# Altium footprint library CapacitorsTHD.PcbLib: 46 footprints (part 2 of 3)
Each footprint in its own frame and in the unit in brackets; x right, y up, seen from the top. Pads: shape width x height; smd on the part's side, far side on the other; paste and mask are expansions set on the pad; w line width, h text height; cw(c..) or ccw(c..) is an arc to the next point about the centre after c.
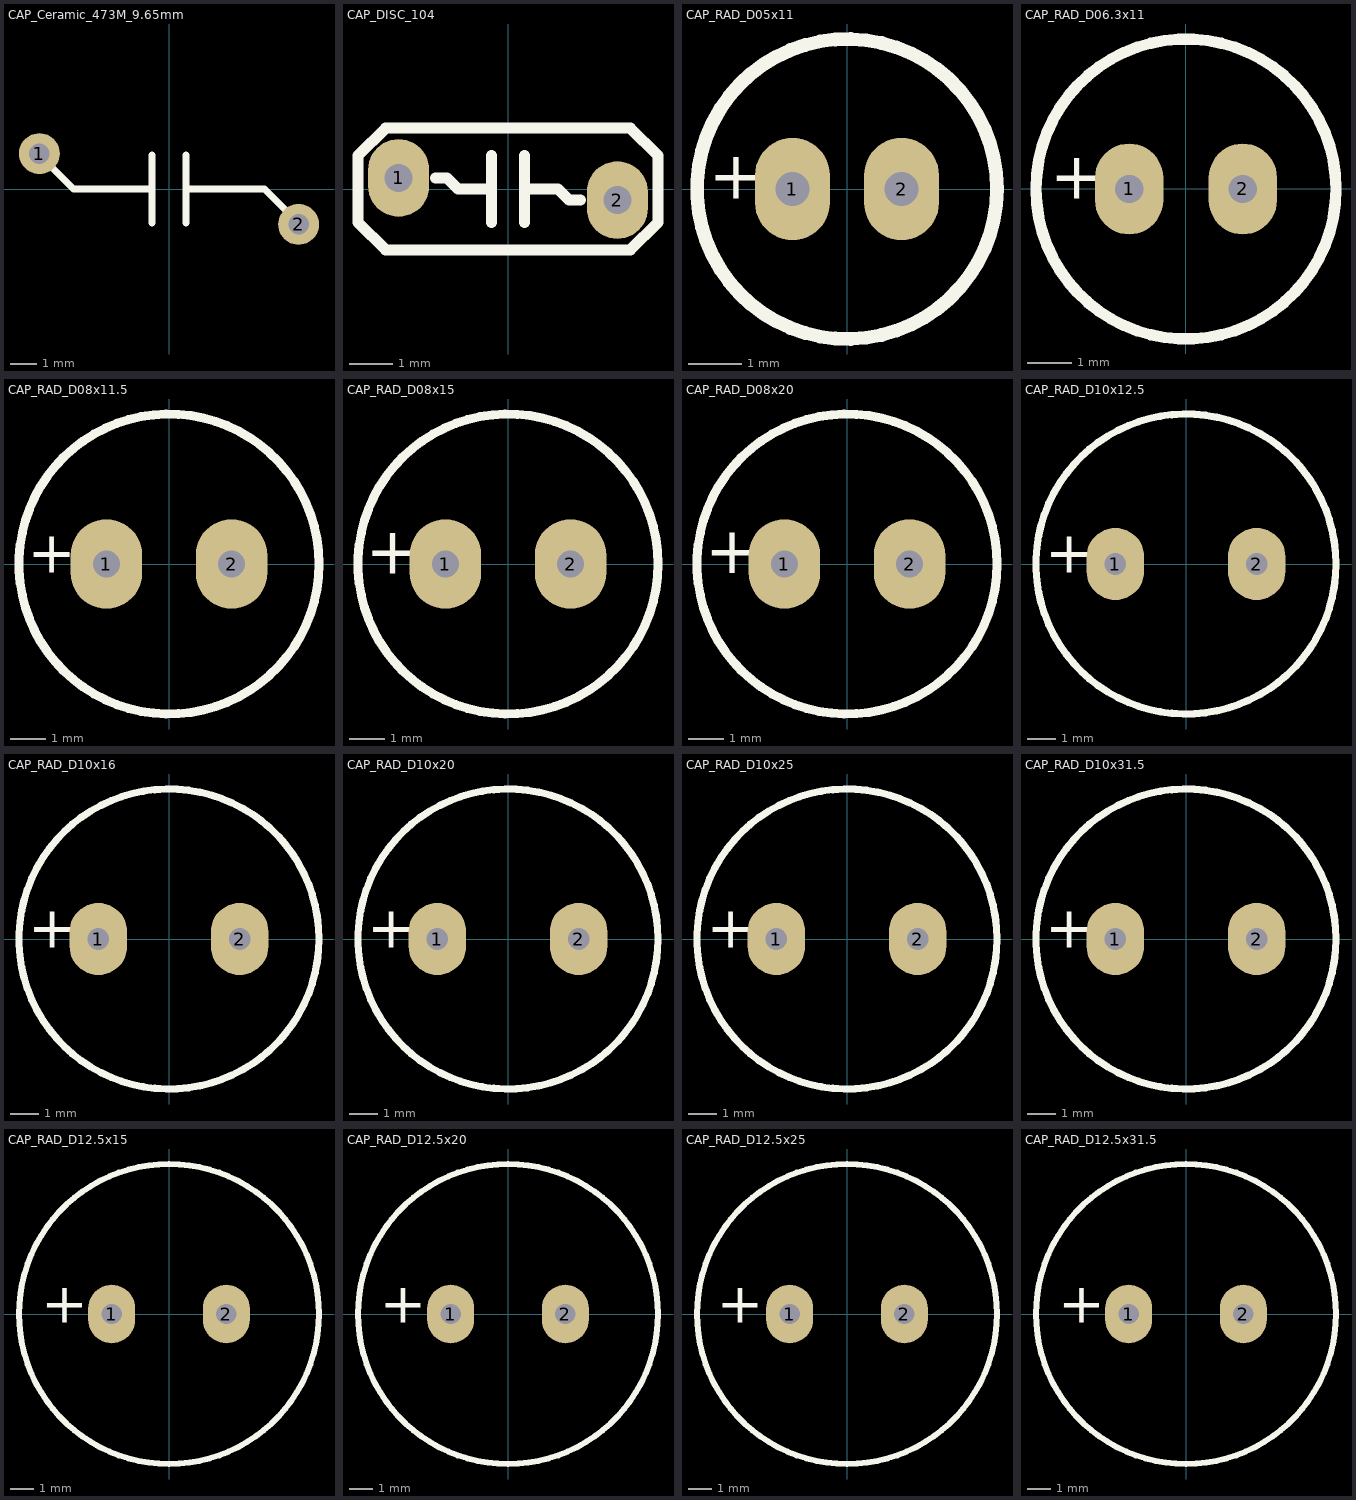
[diagram p1: the footprints below, top view; thin cyan lines are the x and y axes]

## CAP_Ceramic_473M_9.65mm [mil]
pads (2):
  round 60 hole 30: 1(-190,52) 2(190,-52)
Top Overlay:
  lines w10: -170,30 -140,0 -100,0 -25,0 ; -25,-50 -25,50 ; 25,50 25,-50 25,0 75,0 100,0 140,0 170,-30
3D body "User Library-Y1222.STEP": height 354.33, standoff -137.8, extent -201.88,-92.51 201.9,92.52

## CAP_DISC_104 [mil]
pads (2):
  oval 55x70 hole 25: 1(-98.43,10) 2(98.43,-10)
Top Overlay:
  lines w10: -65,10 -55,10 -45,0 -15,0 ; -15,-30 -15,30 ; 15,-30 15,30 ; 15,0 45,0 55,-10 65,-10 ; -135,-30 -135,30 -110,55 110,55 135,30 135,-30 110,-55 -110,-55 -135,-30
3D body "disccap.SLDPRT": height 318.07, standoff -902.36, extent -118.1,-39.64 118,39.46

## CAP_RAD_D05x11 [mil]
pads (2):
  oval 55x75 hole 25: 1(-40,0) 2(40,0)
Top Overlay:
  circle w10: c0,0 r110
  text "+" at -101.43,-18.93 h60
3D body "CAP_RAD_D5x11_POL_BK.stp": height 492.13, standoff -98.43, extent -108.26,-108.26 108.28,108.27

## CAP_RAD_D06.3x11 [mil]
pads (2):
  oval 60x80 hole 25: 1(-50,0) 2(50,0)
Top Overlay:
  circle w10: c0,0 r132
  text "+" at -119.68,-22.1 h70
3D body "CAP_RAD_D6.3x11_POL_BK.stp": height 492.13, standoff -98.43, extent -133.85,-133.84 133.87,133.85

## CAP_RAD_D08x11.5 [mil]
pads (2):
  oval 80x100 hole 30: 1(-70,0) 2(70,0)
Top Overlay:
  circle w10: c0,0 r167.63
  text "+" at -157.91,-25.23 h80
3D body "CAP_RAD_D8x11.5_POL_BK.stp": height 511.81, standoff -98.43, extent -167.32,-167.31 167.33,167.32

## CAP_RAD_D08x15 [mil]
pads (2):
  oval 80x100 hole 30: 1(-70,0) 2(70,0)
Top Overlay:
  circle w10: c0,0 r167.63
  text "+" at -159.16,-28.41 h90
3D body "CAP_RAD_D8x15_POL_BK.stp": height 649.61, standoff -98.43, extent -167.32,-167.31 167.33,167.32

## CAP_RAD_D08x20 [mil]
pads (2):
  oval 80x100 hole 30: 1(-70,0) 2(70,0)
Top Overlay:
  circle w10: c0,0 r167.63
  text "+" at -158.16,-27.41 h90
3D body "CAP_RAD_D8x20_POL_BK.stp": height 866.14, standoff -98.43, extent -167.31,-167.31 167.33,167.32

## CAP_RAD_D10x12.5 [mil]
pads (2):
  oval 80x100 hole 30: 1(-98,0) 2(98,0)
Top Overlay:
  circle w10: c0,0 r208.09
  text "+" at -195.38,-31.54 h100
3D body "CAP_RAD_D10x12.5_POL_BK.stp": height 551.18, standoff -98.43, extent -206.69,-206.58 206.7,206.6

## CAP_RAD_D10x16 [mil]
pads (2):
  oval 80x100 hole 30: 1(-98,0) 2(98,0)
Top Overlay:
  circle w10: c0,0 r208.09
  text "+" at -195.38,-31.54 h100
3D body "CAP_RAD_D10x16_POL_BK.stp": height 688.98, standoff -98.43, extent -206.69,-206.59 206.7,206.6

## CAP_RAD_D10x20 [mil]
pads (2):
  oval 80x100 hole 30: 1(-98,0) 2(98,0)
Top Overlay:
  circle w10: c0,0 r208.09
  text "+" at -195.38,-31.54 h100
3D body "CAP_RAD_D10x20_POL_BK.stp": height 866.14, standoff -98.43, extent -206.69,-206.59 206.7,206.6

## CAP_RAD_D10x25 [mil]
pads (2):
  oval 80x100 hole 30: 1(-98,0) 2(98,0)
Top Overlay:
  circle w10: c0,0 r208.09
  text "+" at -194.38,-31.54 h100
3D body "CAP_RAD_D10x25_POL_BK.stp": height 1062.99, standoff -98.43, extent -206.68,-206.63 206.7,206.65

## CAP_RAD_D10x31.5 [mil]
pads (2):
  oval 80x100 hole 30: 1(-98,0) 2(98,0)
Top Overlay:
  circle w10: c0,0 r208.09
  text "+" at -195.38,-31.54 h100
3D body "CAP_RAD_D10x31.5_POL_BK.stp": height 1318.9, standoff -98.43, extent -206.69,-206.56 206.7,206.58

## CAP_RAD_D12.5x15 [mil]
pads (2):
  oval 80x100 hole 35: 1(-98,0) 2(98,0)
Top Overlay:
  circle w10: c0,0 r256.22
  text "+" at -217.89,-37.89 h120
3D body "CAP_RAD_D12.5x15_POL_BK.stp": height 649.61, standoff -98.43, extent -255.9,-255.85 255.91,255.86

## CAP_RAD_D12.5x20 [mil]
pads (2):
  oval 80x100 hole 35: 1(-98,0) 2(98,0)
Top Overlay:
  circle w10: c0,0 r256.22
  text "+" at -218.89,-37.89 h120
3D body "CAP_RAD_D12.5x20_POL_BK.stp": height 866.14, standoff -98.43, extent -255.89,-255.85 255.91,255.86

## CAP_RAD_D12.5x25 [mil]
pads (2):
  oval 80x100 hole 35: 1(-98,0) 2(98,0)
Top Overlay:
  circle w10: c0,0 r256.22
  text "+" at -222.89,-37.89 h120
3D body "CAP_RAD_D12.5x25_POL_BK.stp": height 1062.99, standoff -98.43, extent -255.9,-255.9 255.91,255.91

## CAP_RAD_D12.5x31.5 [mil]
pads (2):
  oval 80x100 hole 35: 1(-98,0) 2(98,0)
Top Overlay:
  circle w10: c0,0 r256.22
  text "+" at -218.45,-38.16 h120
3D body "CAP_RAD_D12.5x31.5_POL_BK.stp": height 1318.9, standoff -98.43, extent -255.9,-255.84 255.91,255.85